# Altium footprint library CONN_HDR_MINI_ST_SMD.PcbLib: 102 footprints (part 5 of 7)
Each footprint in its own frame and in the unit in brackets; x right, y up, seen from the top. Pads: shape width x height; smd on the part's side, far side on the other; paste and mask are expansions set on the pad; w line width, h text height; cw(c..) or ccw(c..) is an arc to the next point about the centre after c.
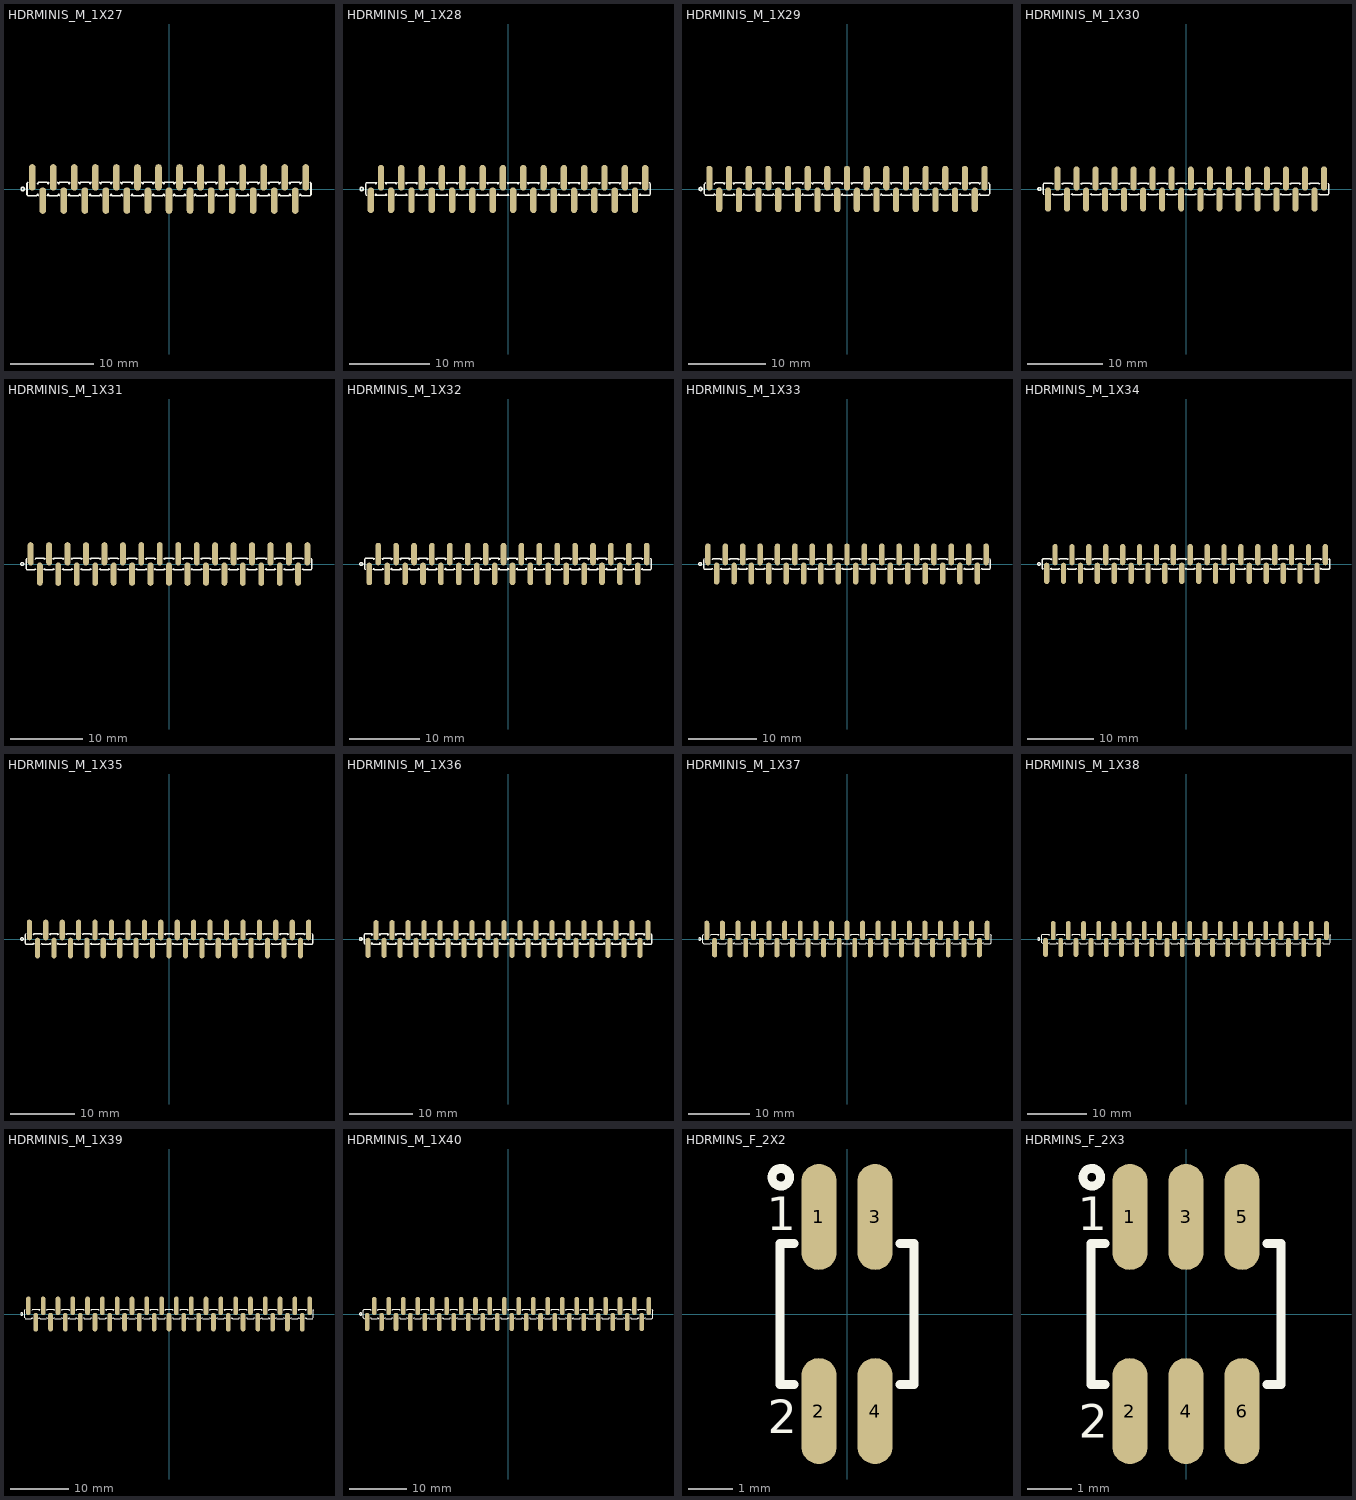
[diagram p4: the footprints below, top view; thin cyan lines are the x and y axes]

## HDRMINIS_M_1X27 [mm] "mini header (50mil pitch)"
pads (27):
  oval 0.8x3.2 smd mask+0.1: 1(-16.51,1.4) 2(-15.24,-1.4) 3(-13.97,1.4) 4(-12.7,-1.4) 5(-11.43,1.4) 6(-10.16,-1.4) 7(-8.89,1.4) 8(-7.62,-1.4) 9(-6.35,1.4) 10(-5.08,-1.4) 11(-3.81,1.4) 12(-2.54,-1.4) 13(-1.27,1.4) 14(0,-1.4) 15(1.27,1.4) 16(2.54,-1.4) 17(3.81,1.4) 18(5.08,-1.4) 19(6.35,1.4) 20(7.62,-1.4) 21(8.89,1.4) 22(10.16,-1.4) 23(11.43,1.4) 24(12.7,-1.4) 25(13.97,1.4) 26(15.24,-1.4) 27(16.51,1.4)
Top Overlay:
  circle w0.2: c-17.653,0 r0.2
  lines w0.2: -17.046,0.8 -17.145,0.635 -17.145,-0.635 -17.046,-0.8 -15.974,-0.8 -15.875,-0.635 -15.776,-0.8 ; -15.875,0.635 -15.776,0.8 -14.704,0.8 -14.605,0.635 -14.506,0.8 ; -14.704,-0.8 -14.605,-0.635 -14.506,-0.8 -13.434,-0.8 -13.335,-0.635 -13.236,-0.8 ; -13.434,0.8 -13.335,0.635 -13.236,0.8 -12.164,0.8 -12.065,0.635 -11.966,0.8 ; -12.164,-0.8 -12.065,-0.635 -11.966,-0.8 -10.894,-0.8 -10.795,-0.635 -10.696,-0.8 ; -10.894,0.8 -10.795,0.635 -10.696,0.8 -9.624,0.8 -9.525,0.635 -9.426,0.8 ; -9.624,-0.8 -9.525,-0.635 -9.426,-0.8 -8.354,-0.8 -8.255,-0.635 -8.156,-0.8 ; -8.354,0.8 -8.255,0.635 -8.156,0.8 -7.084,0.8 -6.985,0.635 -6.886,0.8 ; -7.084,-0.8 -6.985,-0.635 -6.886,-0.8 -5.814,-0.8 -5.715,-0.635 -5.616,-0.8 ; -5.814,0.8 -5.715,0.635 -5.616,0.8 -4.544,0.8 -4.445,0.635 -4.346,0.8 ; -4.544,-0.8 -4.445,-0.635 -4.346,-0.8 -3.274,-0.8 -3.175,-0.635 -3.076,-0.8 ; -3.274,0.8 -3.175,0.635 -3.076,0.8 -2.004,0.8 -1.905,0.635 -1.806,0.8 ; -2.004,-0.8 -1.905,-0.635 -1.806,-0.8 -0.734,-0.8 -0.635,-0.635 -0.536,-0.8 ; -0.734,0.8 -0.635,0.635 -0.536,0.8 0.536,0.8 0.635,0.635 0.734,0.8 ; 0.536,-0.8 0.635,-0.635 0.734,-0.8 1.806,-0.8 1.905,-0.635 2.004,-0.8 ; 1.806,0.8 1.905,0.635 2.004,0.8 3.076,0.8 3.175,0.635 3.274,0.8 ; 3.076,-0.8 3.175,-0.635 3.274,-0.8 4.346,-0.8 4.445,-0.635 4.544,-0.8 ; 4.346,0.8 4.445,0.635 4.544,0.8 5.616,0.8 5.715,0.635 5.814,0.8 ; 5.616,-0.8 5.715,-0.635 5.814,-0.8 6.886,-0.8 6.985,-0.635 7.084,-0.8 ; 6.886,0.8 6.985,0.635 7.084,0.8 8.156,0.8 8.255,0.635 8.354,0.8 ; 8.156,-0.8 8.255,-0.635 8.354,-0.8 9.426,-0.8 9.525,-0.635 9.624,-0.8 ; 9.426,0.8 9.525,0.635 9.624,0.8 10.696,0.8 10.795,0.635 10.894,0.8 ; 10.696,-0.8 10.795,-0.635 10.894,-0.8 11.966,-0.8 12.065,-0.635 12.164,-0.8 ; 11.966,0.8 12.065,0.635 12.164,0.8 13.236,0.8 13.335,0.635 13.434,0.8 ; 13.236,-0.8 13.335,-0.635 13.434,-0.8 14.506,-0.8 14.605,-0.635 14.704,-0.8 ; 14.506,0.8 14.605,0.635 14.704,0.8 15.776,0.8 15.875,0.635 15.974,0.8 ; 15.776,-0.8 15.875,-0.635 15.974,-0.8 17.046,-0.8 17.145,-0.635 17.145,0.635 17.046,0.8
3D body "BD021-02A-A1-0350-0200-0550-LB.stp": height 5.5, standoff 0, extent 14.605,-2.75 17.145,2.75
3D body "BD021-02A-A1-0350-0200-0550-LB.stp": height 5.5, standoff 0, extent 12.065,-2.75 14.605,2.75
3D body "BD021-02A-A1-0350-0200-0550-LB.stp": height 5.5, standoff 0, extent 9.525,-2.75 12.065,2.75
3D body "BD021-02A-A1-0350-0200-0550-LB.stp": height 5.5, standoff 0, extent 6.985,-2.75 9.525,2.75
3D body "BD021-02A-A1-0350-0200-0550-LB.stp": height 5.5, standoff 0, extent 4.445,-2.75 6.985,2.75
3D body "BD021-02A-A1-0350-0200-0550-LB.stp": height 5.5, standoff 0, extent 1.905,-2.75 4.445,2.75
3D body "BD021-02A-A1-0350-0200-0550-LB.stp": height 5.5, standoff 0, extent -0.635,-2.75 1.905,2.75
3D body "BD021-02A-A1-0350-0200-0550-LB.stp": height 5.5, standoff 0, extent -3.175,-2.75 -0.635,2.75
3D body "BD021-02A-A1-0350-0200-0550-LB.stp": height 5.5, standoff 0, extent -5.715,-2.75 -3.175,2.75
3D body "BD021-02A-A1-0350-0200-0550-LB.stp": height 5.5, standoff 0, extent -8.255,-2.75 -5.715,2.75
3D body "BD021-02A-A1-0350-0200-0550-LB.stp": height 5.5, standoff 0, extent -10.795,-2.75 -8.255,2.75
3D body "BD021-02A-A1-0350-0200-0550-LB.stp": height 5.5, standoff 0, extent -13.335,-2.75 -10.795,2.75
3D body "BD021-03A-A1-0350-0200-0550-LB.stp": height 5.5, standoff 0, extent -17.15,-2.75 -13.34,2.75

## HDRMINIS_M_1X28 [mm] "mini header (50mil pitch)"
pads (28):
  oval 0.8x3.2 smd mask+0.1: 1(-17.145,-1.4) 2(-15.875,1.4) 3(-14.605,-1.4) 4(-13.335,1.4) 5(-12.065,-1.4) 6(-10.795,1.4) 7(-9.525,-1.4) 8(-8.255,1.4) 9(-6.985,-1.4) 10(-5.715,1.4) 11(-4.445,-1.4) 12(-3.175,1.4) 13(-1.905,-1.4) 14(-0.635,1.4) 15(0.635,-1.4) 16(1.905,1.4) 17(3.175,-1.4) 18(4.445,1.4) 19(5.715,-1.4) 20(6.985,1.4) 21(8.255,-1.4) 22(9.525,1.4) 23(10.795,-1.4) 24(12.065,1.4) 25(13.335,-1.4) 26(14.605,1.4) 27(15.875,-1.4) 28(17.145,1.4)
Top Overlay:
  circle w0.2: c-18.288,0 r0.2
  lines w0.2: -17.681,-0.8 -17.78,-0.635 -17.78,0.635 -17.681,0.8 -16.609,0.8 -16.51,0.635 -16.411,0.8 ; -16.609,-0.8 -16.51,-0.635 -16.411,-0.8 -15.339,-0.8 -15.24,-0.635 -15.141,-0.8 ; -15.339,0.8 -15.24,0.635 -15.141,0.8 -14.069,0.8 -13.97,0.635 -13.871,0.8 ; -14.069,-0.8 -13.97,-0.635 -13.871,-0.8 -12.799,-0.8 -12.7,-0.635 -12.601,-0.8 ; -12.799,0.8 -12.7,0.635 -12.601,0.8 -11.529,0.8 -11.43,0.635 -11.331,0.8 ; -11.529,-0.8 -11.43,-0.635 -11.331,-0.8 -10.259,-0.8 -10.16,-0.635 -10.061,-0.8 ; -10.259,0.8 -10.16,0.635 -10.061,0.8 -8.989,0.8 -8.89,0.635 -8.791,0.8 ; -8.989,-0.8 -8.89,-0.635 -8.791,-0.8 -7.719,-0.8 -7.62,-0.635 -7.521,-0.8 ; -7.719,0.8 -7.62,0.635 -7.521,0.8 -6.449,0.8 -6.35,0.635 -6.251,0.8 ; -6.449,-0.8 -6.35,-0.635 -6.251,-0.8 -5.179,-0.8 -5.08,-0.635 -4.981,-0.8 ; -5.179,0.8 -5.08,0.635 -4.981,0.8 -3.909,0.8 -3.81,0.635 -3.711,0.8 ; -3.909,-0.8 -3.81,-0.635 -3.711,-0.8 -2.639,-0.8 -2.54,-0.635 -2.441,-0.8 ; -2.639,0.8 -2.54,0.635 -2.441,0.8 -1.369,0.8 -1.27,0.635 -1.171,0.8 ; -1.369,-0.8 -1.27,-0.635 -1.171,-0.8 -0.099,-0.8 0,-0.635 0.099,-0.8 ; -0.099,0.8 0,0.635 0.099,0.8 1.171,0.8 1.27,0.635 1.369,0.8 ; 1.171,-0.8 1.27,-0.635 1.369,-0.8 2.441,-0.8 2.54,-0.635 2.639,-0.8 ; 2.441,0.8 2.54,0.635 2.639,0.8 3.711,0.8 3.81,0.635 3.909,0.8 ; 3.711,-0.8 3.81,-0.635 3.909,-0.8 4.981,-0.8 5.08,-0.635 5.179,-0.8 ; 4.981,0.8 5.08,0.635 5.179,0.8 6.251,0.8 6.35,0.635 6.449,0.8 ; 6.251,-0.8 6.35,-0.635 6.449,-0.8 7.521,-0.8 7.62,-0.635 7.719,-0.8 ; 7.521,0.8 7.62,0.635 7.719,0.8 8.791,0.8 8.89,0.635 8.989,0.8 ; 8.791,-0.8 8.89,-0.635 8.989,-0.8 10.061,-0.8 10.16,-0.635 10.259,-0.8 ; 10.061,0.8 10.16,0.635 10.259,0.8 11.331,0.8 11.43,0.635 11.529,0.8 ; 11.331,-0.8 11.43,-0.635 11.529,-0.8 12.601,-0.8 12.7,-0.635 12.799,-0.8 ; 12.601,0.8 12.7,0.635 12.799,0.8 13.871,0.8 13.97,0.635 14.069,0.8 ; 13.871,-0.8 13.97,-0.635 14.069,-0.8 15.141,-0.8 15.24,-0.635 15.339,-0.8 ; 15.141,0.8 15.24,0.635 15.339,0.8 16.411,0.8 16.51,0.635 16.609,0.8 ; 16.411,-0.8 16.51,-0.635 16.609,-0.8 17.681,-0.8 17.78,-0.635 17.78,0.635 17.681,0.8
3D body "BD021-02A-A1-0350-0200-0550-LB.stp": height 5.5, standoff 0, extent -17.78,-2.75 -15.24,2.75
3D body "BD021-02A-A1-0350-0200-0550-LB.stp": height 5.5, standoff 0, extent -15.24,-2.75 -12.7,2.75
3D body "BD021-02A-A1-0350-0200-0550-LB.stp": height 5.5, standoff 0, extent -12.7,-2.75 -10.16,2.75
3D body "BD021-02A-A1-0350-0200-0550-LB.stp": height 5.5, standoff 0, extent -10.16,-2.75 -7.62,2.75
3D body "BD021-02A-A1-0350-0200-0550-LB.stp": height 5.5, standoff 0, extent -7.62,-2.75 -5.08,2.75
3D body "BD021-02A-A1-0350-0200-0550-LB.stp": height 5.5, standoff 0, extent -5.08,-2.75 -2.54,2.75
3D body "BD021-02A-A1-0350-0200-0550-LB.stp": height 5.5, standoff 0, extent -2.54,-2.75 0,2.75
3D body "BD021-02A-A1-0350-0200-0550-LB.stp": height 5.5, standoff 0, extent 0,-2.75 2.54,2.75
3D body "BD021-02A-A1-0350-0200-0550-LB.stp": height 5.5, standoff 0, extent 2.54,-2.75 5.08,2.75
3D body "BD021-02A-A1-0350-0200-0550-LB.stp": height 5.5, standoff 0, extent 5.08,-2.75 7.62,2.75
3D body "BD021-02A-A1-0350-0200-0550-LB.stp": height 5.5, standoff 0, extent 7.62,-2.75 10.16,2.75
3D body "BD021-02A-A1-0350-0200-0550-LB.stp": height 5.5, standoff 0, extent 10.16,-2.75 12.7,2.75
3D body "BD021-02A-A1-0350-0200-0550-LB.stp": height 5.5, standoff 0, extent 12.7,-2.75 15.24,2.75
3D body "BD021-02A-A1-0350-0200-0550-LB.stp": height 5.5, standoff 0, extent 15.24,-2.75 17.78,2.75

## HDRMINIS_M_1X29 [mm] "mini header (50mil pitch)"
pads (29):
  oval 0.8x3.2 smd mask+0.1: 1(-17.78,1.4) 2(-16.51,-1.4) 3(-15.24,1.4) 4(-13.97,-1.4) 5(-12.7,1.4) 6(-11.43,-1.4) 7(-10.16,1.4) 8(-8.89,-1.4) 9(-7.62,1.4) 10(-6.35,-1.4) 11(-5.08,1.4) 12(-3.81,-1.4) 13(-2.54,1.4) 14(-1.27,-1.4) 15(0,1.4) 16(1.27,-1.4) 17(2.54,1.4) 18(3.81,-1.4) 19(5.08,1.4) 20(6.35,-1.4) 21(7.62,1.4) 22(8.89,-1.4) 23(10.16,1.4) 24(11.43,-1.4) 25(12.7,1.4) 26(13.97,-1.4) 27(15.24,1.4) 28(16.51,-1.4) 29(17.78,1.4)
Top Overlay:
  circle w0.2: c-18.923,0 r0.2
  lines w0.2: -18.316,0.8 -18.415,0.635 -18.415,-0.635 -18.316,-0.8 -17.244,-0.8 -17.145,-0.635 -17.046,-0.8 ; -17.145,0.635 -17.046,0.8 -15.974,0.8 -15.875,0.635 -15.776,0.8 ; -15.974,-0.8 -15.875,-0.635 -15.776,-0.8 -14.704,-0.8 -14.605,-0.635 -14.506,-0.8 ; -14.704,0.8 -14.605,0.635 -14.506,0.8 -13.434,0.8 -13.335,0.635 -13.236,0.8 ; -13.434,-0.8 -13.335,-0.635 -13.236,-0.8 -12.164,-0.8 -12.065,-0.635 -11.966,-0.8 ; -12.164,0.8 -12.065,0.635 -11.966,0.8 -10.894,0.8 -10.795,0.635 -10.696,0.8 ; -10.894,-0.8 -10.795,-0.635 -10.696,-0.8 -9.624,-0.8 -9.525,-0.635 -9.426,-0.8 ; -9.624,0.8 -9.525,0.635 -9.426,0.8 -8.354,0.8 -8.255,0.635 -8.156,0.8 ; -8.354,-0.8 -8.255,-0.635 -8.156,-0.8 -7.084,-0.8 -6.985,-0.635 -6.886,-0.8 ; -7.084,0.8 -6.985,0.635 -6.886,0.8 -5.814,0.8 -5.715,0.635 -5.616,0.8 ; -5.814,-0.8 -5.715,-0.635 -5.616,-0.8 -4.544,-0.8 -4.445,-0.635 -4.346,-0.8 ; -4.544,0.8 -4.445,0.635 -4.346,0.8 -3.274,0.8 -3.175,0.635 -3.076,0.8 ; -3.274,-0.8 -3.175,-0.635 -3.076,-0.8 -2.004,-0.8 -1.905,-0.635 -1.806,-0.8 ; -2.004,0.8 -1.905,0.635 -1.806,0.8 -0.734,0.8 -0.635,0.635 -0.536,0.8 ; -0.734,-0.8 -0.635,-0.635 -0.536,-0.8 0.536,-0.8 0.635,-0.635 0.734,-0.8 ; 0.536,0.8 0.635,0.635 0.734,0.8 1.806,0.8 1.905,0.635 2.004,0.8 ; 1.806,-0.8 1.905,-0.635 2.004,-0.8 3.076,-0.8 3.175,-0.635 3.274,-0.8 ; 3.076,0.8 3.175,0.635 3.274,0.8 4.346,0.8 4.445,0.635 4.544,0.8 ; 4.346,-0.8 4.445,-0.635 4.544,-0.8 5.616,-0.8 5.715,-0.635 5.814,-0.8 ; 5.616,0.8 5.715,0.635 5.814,0.8 6.886,0.8 6.985,0.635 7.084,0.8 ; 6.886,-0.8 6.985,-0.635 7.084,-0.8 8.156,-0.8 8.255,-0.635 8.354,-0.8 ; 8.156,0.8 8.255,0.635 8.354,0.8 9.426,0.8 9.525,0.635 9.624,0.8 ; 9.426,-0.8 9.525,-0.635 9.624,-0.8 10.696,-0.8 10.795,-0.635 10.894,-0.8 ; 10.696,0.8 10.795,0.635 10.894,0.8 11.966,0.8 12.065,0.635 12.164,0.8 ; 11.966,-0.8 12.065,-0.635 12.164,-0.8 13.236,-0.8 13.335,-0.635 13.434,-0.8 ; 13.236,0.8 13.335,0.635 13.434,0.8 14.506,0.8 14.605,0.635 14.704,0.8 ; 14.506,-0.8 14.605,-0.635 14.704,-0.8 15.776,-0.8 15.875,-0.635 15.974,-0.8 ; 15.776,0.8 15.875,0.635 15.974,0.8 17.046,0.8 17.145,0.635 17.244,0.8 ; 17.046,-0.8 17.145,-0.635 17.244,-0.8 18.316,-0.8 18.415,-0.635 18.415,0.635 18.316,0.8
3D body "BD021-02A-A1-0350-0200-0550-LB.stp": height 5.5, standoff 0, extent 15.875,-2.75 18.415,2.75
3D body "BD021-02A-A1-0350-0200-0550-LB.stp": height 5.5, standoff 0, extent 13.335,-2.75 15.875,2.75
3D body "BD021-02A-A1-0350-0200-0550-LB.stp": height 5.5, standoff 0, extent 10.795,-2.75 13.335,2.75
3D body "BD021-02A-A1-0350-0200-0550-LB.stp": height 5.5, standoff 0, extent 8.255,-2.75 10.795,2.75
3D body "BD021-02A-A1-0350-0200-0550-LB.stp": height 5.5, standoff 0, extent 5.715,-2.75 8.255,2.75
3D body "BD021-02A-A1-0350-0200-0550-LB.stp": height 5.5, standoff 0, extent 3.175,-2.75 5.715,2.75
3D body "BD021-02A-A1-0350-0200-0550-LB.stp": height 5.5, standoff 0, extent 0.635,-2.75 3.175,2.75
3D body "BD021-02A-A1-0350-0200-0550-LB.stp": height 5.5, standoff 0, extent -1.905,-2.75 0.635,2.75
3D body "BD021-02A-A1-0350-0200-0550-LB.stp": height 5.5, standoff 0, extent -4.445,-2.75 -1.905,2.75
3D body "BD021-02A-A1-0350-0200-0550-LB.stp": height 5.5, standoff 0, extent -6.985,-2.75 -4.445,2.75
3D body "BD021-02A-A1-0350-0200-0550-LB.stp": height 5.5, standoff 0, extent -9.525,-2.75 -6.985,2.75
3D body "BD021-02A-A1-0350-0200-0550-LB.stp": height 5.5, standoff 0, extent -12.065,-2.75 -9.525,2.75
3D body "BD021-02A-A1-0350-0200-0550-LB.stp": height 5.5, standoff 0, extent -14.605,-2.75 -12.065,2.75
3D body "BD021-03A-A1-0350-0200-0550-LB.stp": height 5.5, standoff 0, extent -18.42,-2.75 -14.61,2.75

## HDRMINIS_M_1X30 [mm] "mini header (50mil pitch)"
pads (30):
  oval 0.8x3.2 smd mask+0.1: 1(-18.415,-1.4) 2(-17.145,1.4) 3(-15.875,-1.4) 4(-14.605,1.4) 5(-13.335,-1.4) 6(-12.065,1.4) 7(-10.795,-1.4) 8(-9.525,1.4) 9(-8.255,-1.4) 10(-6.985,1.4) 11(-5.715,-1.4) 12(-4.445,1.4) 13(-3.175,-1.4) 14(-1.905,1.4) 15(-0.635,-1.4) 16(0.635,1.4) 17(1.905,-1.4) 18(3.175,1.4) 19(4.445,-1.4) 20(5.715,1.4) 21(6.985,-1.4) 22(8.255,1.4) 23(9.525,-1.4) 24(10.795,1.4) 25(12.065,-1.4) 26(13.335,1.4) 27(14.605,-1.4) 28(15.875,1.4) 29(17.145,-1.4) 30(18.415,1.4)
Top Overlay:
  drawing of 153 lines, arcs and shapes, not listed
3D body "BD021-02A-A1-0350-0200-0550-LB.stp": height 5.5, standoff 0, extent -19.05,-2.75 -16.51,2.75
3D body "BD021-02A-A1-0350-0200-0550-LB.stp": height 5.5, standoff 0, extent -16.51,-2.75 -13.97,2.75
3D body "BD021-02A-A1-0350-0200-0550-LB.stp": height 5.5, standoff 0, extent -13.97,-2.75 -11.43,2.75
3D body "BD021-02A-A1-0350-0200-0550-LB.stp": height 5.5, standoff 0, extent -11.43,-2.75 -8.89,2.75
3D body "BD021-02A-A1-0350-0200-0550-LB.stp": height 5.5, standoff 0, extent -8.89,-2.75 -6.35,2.75
3D body "BD021-02A-A1-0350-0200-0550-LB.stp": height 5.5, standoff 0, extent -6.35,-2.75 -3.81,2.75
3D body "BD021-02A-A1-0350-0200-0550-LB.stp": height 5.5, standoff 0, extent -3.81,-2.75 -1.27,2.75
3D body "BD021-02A-A1-0350-0200-0550-LB.stp": height 5.5, standoff 0, extent -1.27,-2.75 1.27,2.75
3D body "BD021-02A-A1-0350-0200-0550-LB.stp": height 5.5, standoff 0, extent 1.27,-2.75 3.81,2.75
3D body "BD021-02A-A1-0350-0200-0550-LB.stp": height 5.5, standoff 0, extent 3.81,-2.75 6.35,2.75
3D body "BD021-02A-A1-0350-0200-0550-LB.stp": height 5.5, standoff 0, extent 6.35,-2.75 8.89,2.75
3D body "BD021-02A-A1-0350-0200-0550-LB.stp": height 5.5, standoff 0, extent 8.89,-2.75 11.43,2.75
3D body "BD021-02A-A1-0350-0200-0550-LB.stp": height 5.5, standoff 0, extent 11.43,-2.75 13.97,2.75
3D body "BD021-02A-A1-0350-0200-0550-LB.stp": height 5.5, standoff 0, extent 13.97,-2.75 16.51,2.75
3D body "BD021-02A-A1-0350-0200-0550-LB.stp": height 5.5, standoff 0, extent 16.51,-2.75 19.05,2.75

## HDRMINIS_M_1X31 [mm] "mini header (50mil pitch)"
pads (31):
  oval 0.8x3.2 smd mask+0.1: 1(-19.05,1.4) 2(-17.78,-1.4) 3(-16.51,1.4) 4(-15.24,-1.4) 5(-13.97,1.4) 6(-12.7,-1.4) 7(-11.43,1.4) 8(-10.16,-1.4) 9(-8.89,1.4) 10(-7.62,-1.4) 11(-6.35,1.4) 12(-5.08,-1.4) 13(-3.81,1.4) 14(-2.54,-1.4) 15(-1.27,1.4) 16(0,-1.4) 17(1.27,1.4) 18(2.54,-1.4) 19(3.81,1.4) 20(5.08,-1.4) 21(6.35,1.4) 22(7.62,-1.4) 23(8.89,1.4) 24(10.16,-1.4) 25(11.43,1.4) 26(12.7,-1.4) 27(13.97,1.4) 28(15.24,-1.4) 29(16.51,1.4) 30(17.78,-1.4) 31(19.05,1.4)
Top Overlay:
  drawing of 157 lines, arcs and shapes, not listed
3D body "BD021-03A-A1-0350-0200-0550-LB.stp": height 5.5, standoff 0, extent -19.69,-2.75 -15.88,2.75
3D body "BD021-02A-A1-0350-0200-0550-LB.stp": height 5.5, standoff 0, extent -15.875,-2.75 -13.335,2.75
3D body "BD021-02A-A1-0350-0200-0550-LB.stp": height 5.5, standoff 0, extent -13.335,-2.75 -10.795,2.75
3D body "BD021-02A-A1-0350-0200-0550-LB.stp": height 5.5, standoff 0, extent -10.795,-2.75 -8.255,2.75
3D body "BD021-02A-A1-0350-0200-0550-LB.stp": height 5.5, standoff 0, extent -8.255,-2.75 -5.715,2.75
3D body "BD021-02A-A1-0350-0200-0550-LB.stp": height 5.5, standoff 0, extent -5.715,-2.75 -3.175,2.75
3D body "BD021-02A-A1-0350-0200-0550-LB.stp": height 5.5, standoff 0, extent -3.175,-2.75 -0.635,2.75
3D body "BD021-02A-A1-0350-0200-0550-LB.stp": height 5.5, standoff 0, extent -0.635,-2.75 1.905,2.75
3D body "BD021-02A-A1-0350-0200-0550-LB.stp": height 5.5, standoff 0, extent 1.905,-2.75 4.445,2.75
3D body "BD021-02A-A1-0350-0200-0550-LB.stp": height 5.5, standoff 0, extent 4.445,-2.75 6.985,2.75
3D body "BD021-02A-A1-0350-0200-0550-LB.stp": height 5.5, standoff 0, extent 6.985,-2.75 9.525,2.75
3D body "BD021-02A-A1-0350-0200-0550-LB.stp": height 5.5, standoff 0, extent 9.525,-2.75 12.065,2.75
3D body "BD021-02A-A1-0350-0200-0550-LB.stp": height 5.5, standoff 0, extent 12.065,-2.75 14.605,2.75
3D body "BD021-02A-A1-0350-0200-0550-LB.stp": height 5.5, standoff 0, extent 14.605,-2.75 17.145,2.75
3D body "BD021-02A-A1-0350-0200-0550-LB.stp": height 5.5, standoff 0, extent 17.145,-2.75 19.685,2.75

## HDRMINIS_M_1X32 [mm] "mini header (50mil pitch)"
pads (32):
  oval 0.8x3.2 smd mask+0.1: 1(-19.685,-1.4) 2(-18.415,1.4) 3(-17.145,-1.4) 4(-15.875,1.4) 5(-14.605,-1.4) 6(-13.335,1.4) 7(-12.065,-1.4) 8(-10.795,1.4) 9(-9.525,-1.4) 10(-8.255,1.4) 11(-6.985,-1.4) 12(-5.715,1.4) 13(-4.445,-1.4) 14(-3.175,1.4) 15(-1.905,-1.4) 16(-0.635,1.4) 17(0.635,-1.4) 18(1.905,1.4) 19(3.175,-1.4) 20(4.445,1.4) 21(5.715,-1.4) 22(6.985,1.4) 23(8.255,-1.4) 24(9.525,1.4) 25(10.795,-1.4) 26(12.065,1.4) 27(13.335,-1.4) 28(14.605,1.4) 29(15.875,-1.4) 30(17.145,1.4) 31(18.415,-1.4) 32(19.685,1.4)
Top Overlay:
  drawing of 163 lines, arcs and shapes, not listed
3D body "BD021-02A-A1-0350-0200-0550-LB.stp": height 5.5, standoff 0, extent -20.32,-2.75 -17.78,2.75
3D body "BD021-02A-A1-0350-0200-0550-LB.stp": height 5.5, standoff 0, extent -17.78,-2.75 -15.24,2.75
3D body "BD021-02A-A1-0350-0200-0550-LB.stp": height 5.5, standoff 0, extent -15.24,-2.75 -12.7,2.75
3D body "BD021-02A-A1-0350-0200-0550-LB.stp": height 5.5, standoff 0, extent -12.7,-2.75 -10.16,2.75
3D body "BD021-02A-A1-0350-0200-0550-LB.stp": height 5.5, standoff 0, extent -10.16,-2.75 -7.62,2.75
3D body "BD021-02A-A1-0350-0200-0550-LB.stp": height 5.5, standoff 0, extent -7.62,-2.75 -5.08,2.75
3D body "BD021-02A-A1-0350-0200-0550-LB.stp": height 5.5, standoff 0, extent -5.08,-2.75 -2.54,2.75
3D body "BD021-02A-A1-0350-0200-0550-LB.stp": height 5.5, standoff 0, extent -2.54,-2.75 0,2.75
3D body "BD021-02A-A1-0350-0200-0550-LB.stp": height 5.5, standoff 0, extent 0,-2.75 2.54,2.75
3D body "BD021-02A-A1-0350-0200-0550-LB.stp": height 5.5, standoff 0, extent 2.54,-2.75 5.08,2.75
3D body "BD021-02A-A1-0350-0200-0550-LB.stp": height 5.5, standoff 0, extent 5.08,-2.75 7.62,2.75
3D body "BD021-02A-A1-0350-0200-0550-LB.stp": height 5.5, standoff 0, extent 7.62,-2.75 10.16,2.75
3D body "BD021-02A-A1-0350-0200-0550-LB.stp": height 5.5, standoff 0, extent 10.16,-2.75 12.7,2.75
3D body "BD021-02A-A1-0350-0200-0550-LB.stp": height 5.5, standoff 0, extent 12.7,-2.75 15.24,2.75
3D body "BD021-02A-A1-0350-0200-0550-LB.stp": height 5.5, standoff 0, extent 15.24,-2.75 17.78,2.75
3D body "BD021-02A-A1-0350-0200-0550-LB.stp": height 5.5, standoff 0, extent 17.78,-2.75 20.32,2.75

## HDRMINIS_M_1X33 [mm] "mini header (50mil pitch)"
pads (33):
  oval 0.8x3.2 smd mask+0.1: 1(-20.32,1.4) 2(-19.05,-1.4) 3(-17.78,1.4) 4(-16.51,-1.4) 5(-15.24,1.4) 6(-13.97,-1.4) 7(-12.7,1.4) 8(-11.43,-1.4) 9(-10.16,1.4) 10(-8.89,-1.4) 11(-7.62,1.4) 12(-6.35,-1.4) 13(-5.08,1.4) 14(-3.81,-1.4) 15(-2.54,1.4) 16(-1.27,-1.4) 17(0,1.4) 18(1.27,-1.4) 19(2.54,1.4) 20(3.81,-1.4) 21(5.08,1.4) 22(6.35,-1.4) 23(7.62,1.4) 24(8.89,-1.4) 25(10.16,1.4) 26(11.43,-1.4) 27(12.7,1.4) 28(13.97,-1.4) 29(15.24,1.4) 30(16.51,-1.4) 31(17.78,1.4) 32(19.05,-1.4) 33(20.32,1.4)
Top Overlay:
  drawing of 167 lines, arcs and shapes, not listed
3D body "BD021-03A-A1-0350-0200-0550-LB.stp": height 5.5, standoff 0, extent -20.96,-2.75 -17.15,2.75
3D body "BD021-02A-A1-0350-0200-0550-LB.stp": height 5.5, standoff 0, extent -17.145,-2.75 -14.605,2.75
3D body "BD021-02A-A1-0350-0200-0550-LB.stp": height 5.5, standoff 0, extent -14.605,-2.75 -12.065,2.75
3D body "BD021-02A-A1-0350-0200-0550-LB.stp": height 5.5, standoff 0, extent -12.065,-2.75 -9.525,2.75
3D body "BD021-02A-A1-0350-0200-0550-LB.stp": height 5.5, standoff 0, extent -9.525,-2.75 -6.985,2.75
3D body "BD021-02A-A1-0350-0200-0550-LB.stp": height 5.5, standoff 0, extent -6.985,-2.75 -4.445,2.75
3D body "BD021-02A-A1-0350-0200-0550-LB.stp": height 5.5, standoff 0, extent -4.445,-2.75 -1.905,2.75
3D body "BD021-02A-A1-0350-0200-0550-LB.stp": height 5.5, standoff 0, extent -1.905,-2.75 0.635,2.75
3D body "BD021-02A-A1-0350-0200-0550-LB.stp": height 5.5, standoff 0, extent 0.635,-2.75 3.175,2.75
3D body "BD021-02A-A1-0350-0200-0550-LB.stp": height 5.5, standoff 0, extent 3.175,-2.75 5.715,2.75
3D body "BD021-02A-A1-0350-0200-0550-LB.stp": height 5.5, standoff 0, extent 5.715,-2.75 8.255,2.75
3D body "BD021-02A-A1-0350-0200-0550-LB.stp": height 5.5, standoff 0, extent 8.255,-2.75 10.795,2.75
3D body "BD021-02A-A1-0350-0200-0550-LB.stp": height 5.5, standoff 0, extent 10.795,-2.75 13.335,2.75
3D body "BD021-02A-A1-0350-0200-0550-LB.stp": height 5.5, standoff 0, extent 13.335,-2.75 15.875,2.75
3D body "BD021-02A-A1-0350-0200-0550-LB.stp": height 5.5, standoff 0, extent 15.875,-2.75 18.415,2.75
3D body "BD021-02A-A1-0350-0200-0550-LB.stp": height 5.5, standoff 0, extent 18.415,-2.75 20.955,2.75

## HDRMINIS_M_1X34 [mm] "mini header (50mil pitch)"
pads (34):
  oval 0.8x3.2 smd mask+0.1: 1(-20.955,-1.4) 2(-19.685,1.4) 3(-18.415,-1.4) 4(-17.145,1.4) 5(-15.875,-1.4) 6(-14.605,1.4) 7(-13.335,-1.4) 8(-12.065,1.4) 9(-10.795,-1.4) 10(-9.525,1.4) 11(-8.255,-1.4) 12(-6.985,1.4) 13(-5.715,-1.4) 14(-4.445,1.4) 15(-3.175,-1.4) 16(-1.905,1.4) 17(-0.635,-1.4) 18(0.635,1.4) 19(1.905,-1.4) 20(3.175,1.4) 21(4.445,-1.4) 22(5.715,1.4) 23(6.985,-1.4) 24(8.255,1.4) 25(9.525,-1.4) 26(10.795,1.4) 27(12.065,-1.4) 28(13.335,1.4) 29(14.605,-1.4) 30(15.875,1.4) 31(17.145,-1.4) 32(18.415,1.4) 33(19.685,-1.4) 34(20.955,1.4)
Top Overlay:
  drawing of 173 lines, arcs and shapes, not listed
3D body "BD021-02A-A1-0350-0200-0550-LB.stp": height 5.5, standoff 0, extent 19.05,-2.75 21.59,2.75
3D body "BD021-02A-A1-0350-0200-0550-LB.stp": height 5.5, standoff 0, extent 16.51,-2.75 19.05,2.75
3D body "BD021-02A-A1-0350-0200-0550-LB.stp": height 5.5, standoff 0, extent 13.97,-2.75 16.51,2.75
3D body "BD021-02A-A1-0350-0200-0550-LB.stp": height 5.5, standoff 0, extent 11.43,-2.75 13.97,2.75
3D body "BD021-02A-A1-0350-0200-0550-LB.stp": height 5.5, standoff 0, extent 8.89,-2.75 11.43,2.75
3D body "BD021-02A-A1-0350-0200-0550-LB.stp": height 5.5, standoff 0, extent 6.35,-2.75 8.89,2.75
3D body "BD021-02A-A1-0350-0200-0550-LB.stp": height 5.5, standoff 0, extent 3.81,-2.75 6.35,2.75
3D body "BD021-02A-A1-0350-0200-0550-LB.stp": height 5.5, standoff 0, extent 1.27,-2.75 3.81,2.75
3D body "BD021-02A-A1-0350-0200-0550-LB.stp": height 5.5, standoff 0, extent -1.27,-2.75 1.27,2.75
3D body "BD021-02A-A1-0350-0200-0550-LB.stp": height 5.5, standoff 0, extent -3.81,-2.75 -1.27,2.75
3D body "BD021-02A-A1-0350-0200-0550-LB.stp": height 5.5, standoff 0, extent -6.35,-2.75 -3.81,2.75
3D body "BD021-02A-A1-0350-0200-0550-LB.stp": height 5.5, standoff 0, extent -8.89,-2.75 -6.35,2.75
3D body "BD021-02A-A1-0350-0200-0550-LB.stp": height 5.5, standoff 0, extent -11.43,-2.75 -8.89,2.75
3D body "BD021-02A-A1-0350-0200-0550-LB.stp": height 5.5, standoff 0, extent -13.97,-2.75 -11.43,2.75
3D body "BD021-02A-A1-0350-0200-0550-LB.stp": height 5.5, standoff 0, extent -16.51,-2.75 -13.97,2.75
3D body "BD021-02A-A1-0350-0200-0550-LB.stp": height 5.5, standoff 0, extent -19.05,-2.75 -16.51,2.75
3D body "BD021-02A-A1-0350-0200-0550-LB.stp": height 5.5, standoff 0, extent -21.59,-2.75 -19.05,2.75

## HDRMINIS_M_1X35 [mm] "mini header (50mil pitch)"
pads (35):
  oval 0.8x3.2 smd mask+0.1: 1(-21.59,1.4) 2(-20.32,-1.4) 3(-19.05,1.4) 4(-17.78,-1.4) 5(-16.51,1.4) 6(-15.24,-1.4) 7(-13.97,1.4) 8(-12.7,-1.4) 9(-11.43,1.4) 10(-10.16,-1.4) 11(-8.89,1.4) 12(-7.62,-1.4) 13(-6.35,1.4) 14(-5.08,-1.4) 15(-3.81,1.4) 16(-2.54,-1.4) 17(-1.27,1.4) 18(0,-1.4) 19(1.27,1.4) 20(2.54,-1.4) 21(3.81,1.4) 22(5.08,-1.4) 23(6.35,1.4) 24(7.62,-1.4) 25(8.89,1.4) 26(10.16,-1.4) 27(11.43,1.4) 28(12.7,-1.4) 29(13.97,1.4) 30(15.24,-1.4) 31(16.51,1.4) 32(17.78,-1.4) 33(19.05,1.4) 34(20.32,-1.4) 35(21.59,1.4)
Top Overlay:
  drawing of 177 lines, arcs and shapes, not listed
3D body "BD021-02A-A1-0350-0200-0550-LB.stp": height 5.5, standoff 0, extent 19.685,-2.75 22.225,2.75
3D body "BD021-02A-A1-0350-0200-0550-LB.stp": height 5.5, standoff 0, extent 17.145,-2.75 19.685,2.75
3D body "BD021-02A-A1-0350-0200-0550-LB.stp": height 5.5, standoff 0, extent 14.605,-2.75 17.145,2.75
3D body "BD021-02A-A1-0350-0200-0550-LB.stp": height 5.5, standoff 0, extent 12.065,-2.75 14.605,2.75
3D body "BD021-02A-A1-0350-0200-0550-LB.stp": height 5.5, standoff 0, extent 9.525,-2.75 12.065,2.75
3D body "BD021-02A-A1-0350-0200-0550-LB.stp": height 5.5, standoff 0, extent 6.985,-2.75 9.525,2.75
3D body "BD021-02A-A1-0350-0200-0550-LB.stp": height 5.5, standoff 0, extent 4.445,-2.75 6.985,2.75
3D body "BD021-02A-A1-0350-0200-0550-LB.stp": height 5.5, standoff 0, extent 1.905,-2.75 4.445,2.75
3D body "BD021-02A-A1-0350-0200-0550-LB.stp": height 5.5, standoff 0, extent -0.635,-2.75 1.905,2.75
3D body "BD021-02A-A1-0350-0200-0550-LB.stp": height 5.5, standoff 0, extent -3.175,-2.75 -0.635,2.75
3D body "BD021-02A-A1-0350-0200-0550-LB.stp": height 5.5, standoff 0, extent -5.715,-2.75 -3.175,2.75
3D body "BD021-02A-A1-0350-0200-0550-LB.stp": height 5.5, standoff 0, extent -8.255,-2.75 -5.715,2.75
3D body "BD021-02A-A1-0350-0200-0550-LB.stp": height 5.5, standoff 0, extent -10.795,-2.75 -8.255,2.75
3D body "BD021-02A-A1-0350-0200-0550-LB.stp": height 5.5, standoff 0, extent -13.335,-2.75 -10.795,2.75
3D body "BD021-02A-A1-0350-0200-0550-LB.stp": height 5.5, standoff 0, extent -15.875,-2.75 -13.335,2.75
3D body "BD021-02A-A1-0350-0200-0550-LB.stp": height 5.5, standoff 0, extent -18.415,-2.75 -15.875,2.75
3D body "BD021-03A-A1-0350-0200-0550-LB.stp": height 5.5, standoff 0, extent -22.23,-2.75 -18.42,2.75

## HDRMINIS_M_1X36 [mm] "mini header (50mil pitch)"
pads (36):
  oval 0.8x3.2 smd mask+0.1: 1(-22.225,-1.4) 2(-20.955,1.4) 3(-19.685,-1.4) 4(-18.415,1.4) 5(-17.145,-1.4) 6(-15.875,1.4) 7(-14.605,-1.4) 8(-13.335,1.4) 9(-12.065,-1.4) 10(-10.795,1.4) 11(-9.525,-1.4) 12(-8.255,1.4) 13(-6.985,-1.4) 14(-5.715,1.4) 15(-4.445,-1.4) 16(-3.175,1.4) 17(-1.905,-1.4) 18(-0.635,1.4) 19(0.635,-1.4) 20(1.905,1.4) 21(3.175,-1.4) 22(4.445,1.4) 23(5.715,-1.4) 24(6.985,1.4) 25(8.255,-1.4) 26(9.525,1.4) 27(10.795,-1.4) 28(12.065,1.4) 29(13.335,-1.4) 30(14.605,1.4) 31(15.875,-1.4) 32(17.145,1.4) 33(18.415,-1.4) 34(19.685,1.4) 35(20.955,-1.4) 36(22.225,1.4)
Top Overlay:
  drawing of 183 lines, arcs and shapes, not listed
3D body "BD021-02A-A1-0350-0200-0550-LB.stp": height 5.5, standoff 0, extent -22.86,-2.75 -20.32,2.75
3D body "BD021-02A-A1-0350-0200-0550-LB.stp": height 5.5, standoff 0, extent -20.32,-2.75 -17.78,2.75
3D body "BD021-02A-A1-0350-0200-0550-LB.stp": height 5.5, standoff 0, extent -17.78,-2.75 -15.24,2.75
3D body "BD021-02A-A1-0350-0200-0550-LB.stp": height 5.5, standoff 0, extent -15.24,-2.75 -12.7,2.75
3D body "BD021-02A-A1-0350-0200-0550-LB.stp": height 5.5, standoff 0, extent -12.7,-2.75 -10.16,2.75
3D body "BD021-02A-A1-0350-0200-0550-LB.stp": height 5.5, standoff 0, extent -10.16,-2.75 -7.62,2.75
3D body "BD021-02A-A1-0350-0200-0550-LB.stp": height 5.5, standoff 0, extent -7.62,-2.75 -5.08,2.75
3D body "BD021-02A-A1-0350-0200-0550-LB.stp": height 5.5, standoff 0, extent -5.08,-2.75 -2.54,2.75
3D body "BD021-02A-A1-0350-0200-0550-LB.stp": height 5.5, standoff 0, extent -2.54,-2.75 0,2.75
3D body "BD021-02A-A1-0350-0200-0550-LB.stp": height 5.5, standoff 0, extent 0,-2.75 2.54,2.75
3D body "BD021-02A-A1-0350-0200-0550-LB.stp": height 5.5, standoff 0, extent 2.54,-2.75 5.08,2.75
3D body "BD021-02A-A1-0350-0200-0550-LB.stp": height 5.5, standoff 0, extent 5.08,-2.75 7.62,2.75
3D body "BD021-02A-A1-0350-0200-0550-LB.stp": height 5.5, standoff 0, extent 7.62,-2.75 10.16,2.75
3D body "BD021-02A-A1-0350-0200-0550-LB.stp": height 5.5, standoff 0, extent 10.16,-2.75 12.7,2.75
3D body "BD021-02A-A1-0350-0200-0550-LB.stp": height 5.5, standoff 0, extent 12.7,-2.75 15.24,2.75
3D body "BD021-02A-A1-0350-0200-0550-LB.stp": height 5.5, standoff 0, extent 15.24,-2.75 17.78,2.75
3D body "BD021-02A-A1-0350-0200-0550-LB.stp": height 5.5, standoff 0, extent 17.78,-2.75 20.32,2.75
3D body "BD021-02A-A1-0350-0200-0550-LB.stp": height 5.5, standoff 0, extent 20.32,-2.75 22.86,2.75

## HDRMINIS_M_1X37 [mm] "mini header (50mil pitch)"
pads (37):
  oval 0.8x3.2 smd mask+0.1: 1(-22.86,1.4) 2(-21.59,-1.4) 3(-20.32,1.4) 4(-19.05,-1.4) 5(-17.78,1.4) 6(-16.51,-1.4) 7(-15.24,1.4) 8(-13.97,-1.4) 9(-12.7,1.4) 10(-11.43,-1.4) 11(-10.16,1.4) 12(-8.89,-1.4) 13(-7.62,1.4) 14(-6.35,-1.4) 15(-5.08,1.4) 16(-3.81,-1.4) 17(-2.54,1.4) 18(-1.27,-1.4) 19(0,1.4) 20(1.27,-1.4) 21(2.54,1.4) 22(3.81,-1.4) 23(5.08,1.4) 24(6.35,-1.4) 25(7.62,1.4) 26(8.89,-1.4) 27(10.16,1.4) 28(11.43,-1.4) 29(12.7,1.4) 30(13.97,-1.4) 31(15.24,1.4) 32(16.51,-1.4) 33(17.78,1.4) 34(19.05,-1.4) 35(20.32,1.4) 36(21.59,-1.4) 37(22.86,1.4)
Top Overlay:
  drawing of 187 lines, arcs and shapes, not listed
3D body "BD021-02A-A1-0350-0200-0550-LB.stp": height 5.5, standoff 0, extent 20.955,-2.75 23.495,2.75
3D body "BD021-02A-A1-0350-0200-0550-LB.stp": height 5.5, standoff 0, extent 18.415,-2.75 20.955,2.75
3D body "BD021-02A-A1-0350-0200-0550-LB.stp": height 5.5, standoff 0, extent 15.875,-2.75 18.415,2.75
3D body "BD021-02A-A1-0350-0200-0550-LB.stp": height 5.5, standoff 0, extent 13.335,-2.75 15.875,2.75
3D body "BD021-02A-A1-0350-0200-0550-LB.stp": height 5.5, standoff 0, extent 10.795,-2.75 13.335,2.75
3D body "BD021-02A-A1-0350-0200-0550-LB.stp": height 5.5, standoff 0, extent 8.255,-2.75 10.795,2.75
3D body "BD021-02A-A1-0350-0200-0550-LB.stp": height 5.5, standoff 0, extent 5.715,-2.75 8.255,2.75
3D body "BD021-02A-A1-0350-0200-0550-LB.stp": height 5.5, standoff 0, extent 3.175,-2.75 5.715,2.75
3D body "BD021-02A-A1-0350-0200-0550-LB.stp": height 5.5, standoff 0, extent 0.635,-2.75 3.175,2.75
3D body "BD021-02A-A1-0350-0200-0550-LB.stp": height 5.5, standoff 0, extent -1.905,-2.75 0.635,2.75
3D body "BD021-02A-A1-0350-0200-0550-LB.stp": height 5.5, standoff 0, extent -4.445,-2.75 -1.905,2.75
3D body "BD021-02A-A1-0350-0200-0550-LB.stp": height 5.5, standoff 0, extent -6.985,-2.75 -4.445,2.75
3D body "BD021-02A-A1-0350-0200-0550-LB.stp": height 5.5, standoff 0, extent -9.525,-2.75 -6.985,2.75
3D body "BD021-02A-A1-0350-0200-0550-LB.stp": height 5.5, standoff 0, extent -12.065,-2.75 -9.525,2.75
3D body "BD021-02A-A1-0350-0200-0550-LB.stp": height 5.5, standoff 0, extent -14.605,-2.75 -12.065,2.75
3D body "BD021-02A-A1-0350-0200-0550-LB.stp": height 5.5, standoff 0, extent -17.145,-2.75 -14.605,2.75
3D body "BD021-02A-A1-0350-0200-0550-LB.stp": height 5.5, standoff 0, extent -19.685,-2.75 -17.145,2.75
3D body "BD021-03A-A1-0350-0200-0550-LB.stp": height 5.5, standoff 0, extent -23.5,-2.75 -19.69,2.75

## HDRMINIS_M_1X38 [mm] "mini header (50mil pitch)"
pads (38):
  oval 0.8x3.2 smd mask+0.1: 1(-23.495,-1.4) 2(-22.225,1.4) 3(-20.955,-1.4) 4(-19.685,1.4) 5(-18.415,-1.4) 6(-17.145,1.4) 7(-15.875,-1.4) 8(-14.605,1.4) 9(-13.335,-1.4) 10(-12.065,1.4) 11(-10.795,-1.4) 12(-9.525,1.4) 13(-8.255,-1.4) 14(-6.985,1.4) 15(-5.715,-1.4) 16(-4.445,1.4) 17(-3.175,-1.4) 18(-1.905,1.4) 19(-0.635,-1.4) 20(0.635,1.4) 21(1.905,-1.4) 22(3.175,1.4) 23(4.445,-1.4) 24(5.715,1.4) 25(6.985,-1.4) 26(8.255,1.4) 27(9.525,-1.4) 28(10.795,1.4) 29(12.065,-1.4) 30(13.335,1.4) 31(14.605,-1.4) 32(15.875,1.4) 33(17.145,-1.4) 34(18.415,1.4) 35(19.685,-1.4) 36(20.955,1.4) 37(22.225,-1.4) 38(23.495,1.4)
Top Overlay:
  drawing of 193 lines, arcs and shapes, not listed
3D body "BD021-02A-A1-0350-0200-0550-LB.stp": height 5.5, standoff 0, extent -24.13,-2.75 -21.59,2.75
3D body "BD021-02A-A1-0350-0200-0550-LB.stp": height 5.5, standoff 0, extent -21.59,-2.75 -19.05,2.75
3D body "BD021-02A-A1-0350-0200-0550-LB.stp": height 5.5, standoff 0, extent -19.05,-2.75 -16.51,2.75
3D body "BD021-02A-A1-0350-0200-0550-LB.stp": height 5.5, standoff 0, extent -16.51,-2.75 -13.97,2.75
3D body "BD021-02A-A1-0350-0200-0550-LB.stp": height 5.5, standoff 0, extent -13.97,-2.75 -11.43,2.75
3D body "BD021-02A-A1-0350-0200-0550-LB.stp": height 5.5, standoff 0, extent -11.43,-2.75 -8.89,2.75
3D body "BD021-02A-A1-0350-0200-0550-LB.stp": height 5.5, standoff 0, extent -8.89,-2.75 -6.35,2.75
3D body "BD021-02A-A1-0350-0200-0550-LB.stp": height 5.5, standoff 0, extent -6.35,-2.75 -3.81,2.75
3D body "BD021-02A-A1-0350-0200-0550-LB.stp": height 5.5, standoff 0, extent -3.81,-2.75 -1.27,2.75
3D body "BD021-02A-A1-0350-0200-0550-LB.stp": height 5.5, standoff 0, extent -1.27,-2.75 1.27,2.75
3D body "BD021-02A-A1-0350-0200-0550-LB.stp": height 5.5, standoff 0, extent 1.27,-2.75 3.81,2.75
3D body "BD021-02A-A1-0350-0200-0550-LB.stp": height 5.5, standoff 0, extent 3.81,-2.75 6.35,2.75
3D body "BD021-02A-A1-0350-0200-0550-LB.stp": height 5.5, standoff 0, extent 6.35,-2.75 8.89,2.75
3D body "BD021-02A-A1-0350-0200-0550-LB.stp": height 5.5, standoff 0, extent 8.89,-2.75 11.43,2.75
3D body "BD021-02A-A1-0350-0200-0550-LB.stp": height 5.5, standoff 0, extent 11.43,-2.75 13.97,2.75
3D body "BD021-02A-A1-0350-0200-0550-LB.stp": height 5.5, standoff 0, extent 13.97,-2.75 16.51,2.75
3D body "BD021-02A-A1-0350-0200-0550-LB.stp": height 5.5, standoff 0, extent 16.51,-2.75 19.05,2.75
3D body "BD021-02A-A1-0350-0200-0550-LB.stp": height 5.5, standoff 0, extent 19.05,-2.75 21.59,2.75
3D body "BD021-02A-A1-0350-0200-0550-LB.stp": height 5.5, standoff 0, extent 21.59,-2.75 24.13,2.75

## HDRMINIS_M_1X39 [mm] "mini header (50mil pitch)"
pads (39):
  oval 0.8x3.2 smd mask+0.1: 1(-24.13,1.4) 2(-22.86,-1.4) 3(-21.59,1.4) 4(-20.32,-1.4) 5(-19.05,1.4) 6(-17.78,-1.4) 7(-16.51,1.4) 8(-15.24,-1.4) 9(-13.97,1.4) 10(-12.7,-1.4) 11(-11.43,1.4) 12(-10.16,-1.4) 13(-8.89,1.4) 14(-7.62,-1.4) 15(-6.35,1.4) 16(-5.08,-1.4) 17(-3.81,1.4) 18(-2.54,-1.4) 19(-1.27,1.4) 20(0,-1.4) 21(1.27,1.4) 22(2.54,-1.4) 23(3.81,1.4) 24(5.08,-1.4) 25(6.35,1.4) 26(7.62,-1.4) 27(8.89,1.4) 28(10.16,-1.4) 29(11.43,1.4) 30(12.7,-1.4) 31(13.97,1.4) 32(15.24,-1.4) 33(16.51,1.4) 34(17.78,-1.4) 35(19.05,1.4) 36(20.32,-1.4) 37(21.59,1.4) 38(22.86,-1.4) 39(24.13,1.4)
Top Overlay:
  drawing of 197 lines, arcs and shapes, not listed
3D body "BD021-03A-A1-0350-0200-0550-LB.stp": height 5.5, standoff 0, extent -24.77,-2.75 -20.96,2.75
3D body "BD021-02A-A1-0350-0200-0550-LB.stp": height 5.5, standoff 0, extent -20.955,-2.75 -18.415,2.75
3D body "BD021-02A-A1-0350-0200-0550-LB.stp": height 5.5, standoff 0, extent -18.415,-2.75 -15.875,2.75
3D body "BD021-02A-A1-0350-0200-0550-LB.stp": height 5.5, standoff 0, extent -15.875,-2.75 -13.335,2.75
3D body "BD021-02A-A1-0350-0200-0550-LB.stp": height 5.5, standoff 0, extent -13.335,-2.75 -10.795,2.75
3D body "BD021-02A-A1-0350-0200-0550-LB.stp": height 5.5, standoff 0, extent -10.795,-2.75 -8.255,2.75
3D body "BD021-02A-A1-0350-0200-0550-LB.stp": height 5.5, standoff 0, extent -8.255,-2.75 -5.715,2.75
3D body "BD021-02A-A1-0350-0200-0550-LB.stp": height 5.5, standoff 0, extent -5.715,-2.75 -3.175,2.75
3D body "BD021-02A-A1-0350-0200-0550-LB.stp": height 5.5, standoff 0, extent -3.175,-2.75 -0.635,2.75
3D body "BD021-02A-A1-0350-0200-0550-LB.stp": height 5.5, standoff 0, extent -0.635,-2.75 1.905,2.75
3D body "BD021-02A-A1-0350-0200-0550-LB.stp": height 5.5, standoff 0, extent 1.905,-2.75 4.445,2.75
3D body "BD021-02A-A1-0350-0200-0550-LB.stp": height 5.5, standoff 0, extent 4.445,-2.75 6.985,2.75
3D body "BD021-02A-A1-0350-0200-0550-LB.stp": height 5.5, standoff 0, extent 6.985,-2.75 9.525,2.75
3D body "BD021-02A-A1-0350-0200-0550-LB.stp": height 5.5, standoff 0, extent 9.525,-2.75 12.065,2.75
3D body "BD021-02A-A1-0350-0200-0550-LB.stp": height 5.5, standoff 0, extent 12.065,-2.75 14.605,2.75
3D body "BD021-02A-A1-0350-0200-0550-LB.stp": height 5.5, standoff 0, extent 14.605,-2.75 17.145,2.75
3D body "BD021-02A-A1-0350-0200-0550-LB.stp": height 5.5, standoff 0, extent 17.145,-2.75 19.685,2.75
3D body "BD021-02A-A1-0350-0200-0550-LB.stp": height 5.5, standoff 0, extent 19.685,-2.75 22.225,2.75
3D body "BD021-02A-A1-0350-0200-0550-LB.stp": height 5.5, standoff 0, extent 22.225,-2.75 24.765,2.75

## HDRMINIS_M_1X40 [mm] "mini header (50mil pitch)"
pads (40):
  oval 0.8x3.2 smd mask+0.1: 1(-24.765,-1.4) 2(-23.495,1.4) 3(-22.225,-1.4) 4(-20.955,1.4) 5(-19.685,-1.4) 6(-18.415,1.4) 7(-17.145,-1.4) 8(-15.875,1.4) 9(-14.605,-1.4) 10(-13.335,1.4) 11(-12.065,-1.4) 12(-10.795,1.4) 13(-9.525,-1.4) 14(-8.255,1.4) 15(-6.985,-1.4) 16(-5.715,1.4) 17(-4.445,-1.4) 18(-3.175,1.4) 19(-1.905,-1.4) 20(-0.635,1.4) 21(0.635,-1.4) 22(1.905,1.4) 23(3.175,-1.4) 24(4.445,1.4) 25(5.715,-1.4) 26(6.985,1.4) 27(8.255,-1.4) 28(9.525,1.4) 29(10.795,-1.4) 30(12.065,1.4) 31(13.335,-1.4) 32(14.605,1.4) 33(15.875,-1.4) 34(17.145,1.4) 35(18.415,-1.4) 36(19.685,1.4) 37(20.955,-1.4) 38(22.225,1.4) 39(23.495,-1.4) 40(24.765,1.4)
Top Overlay:
  drawing of 203 lines, arcs and shapes, not listed
3D body "BD021-02A-A1-0350-0200-0550-LB.stp": height 5.5, standoff 0, extent -25.4,-2.75 -22.86,2.75
3D body "BD021-02A-A1-0350-0200-0550-LB.stp": height 5.5, standoff 0, extent -22.86,-2.75 -20.32,2.75
3D body "BD021-02A-A1-0350-0200-0550-LB.stp": height 5.5, standoff 0, extent -20.32,-2.75 -17.78,2.75
3D body "BD021-02A-A1-0350-0200-0550-LB.stp": height 5.5, standoff 0, extent -17.78,-2.75 -15.24,2.75
3D body "BD021-02A-A1-0350-0200-0550-LB.stp": height 5.5, standoff 0, extent -15.24,-2.75 -12.7,2.75
3D body "BD021-02A-A1-0350-0200-0550-LB.stp": height 5.5, standoff 0, extent -12.7,-2.75 -10.16,2.75
3D body "BD021-02A-A1-0350-0200-0550-LB.stp": height 5.5, standoff 0, extent -10.16,-2.75 -7.62,2.75
3D body "BD021-02A-A1-0350-0200-0550-LB.stp": height 5.5, standoff 0, extent -7.62,-2.75 -5.08,2.75
3D body "BD021-02A-A1-0350-0200-0550-LB.stp": height 5.5, standoff 0, extent -5.08,-2.75 -2.54,2.75
3D body "BD021-02A-A1-0350-0200-0550-LB.stp": height 5.5, standoff 0, extent -2.54,-2.75 0,2.75
3D body "BD021-02A-A1-0350-0200-0550-LB.stp": height 5.5, standoff 0, extent 0,-2.75 2.54,2.75
3D body "BD021-02A-A1-0350-0200-0550-LB.stp": height 5.5, standoff 0, extent 2.54,-2.75 5.08,2.75
3D body "BD021-02A-A1-0350-0200-0550-LB.stp": height 5.5, standoff 0, extent 5.08,-2.75 7.62,2.75
3D body "BD021-02A-A1-0350-0200-0550-LB.stp": height 5.5, standoff 0, extent 7.62,-2.75 10.16,2.75
3D body "BD021-02A-A1-0350-0200-0550-LB.stp": height 5.5, standoff 0, extent 10.16,-2.75 12.7,2.75
3D body "BD021-02A-A1-0350-0200-0550-LB.stp": height 5.5, standoff 0, extent 12.7,-2.75 15.24,2.75
3D body "BD021-02A-A1-0350-0200-0550-LB.stp": height 5.5, standoff 0, extent 15.24,-2.75 17.78,2.75
3D body "BD021-02A-A1-0350-0200-0550-LB.stp": height 5.5, standoff 0, extent 17.78,-2.75 20.32,2.75
3D body "BD021-02A-A1-0350-0200-0550-LB.stp": height 5.5, standoff 0, extent 20.32,-2.75 22.86,2.75
3D body "BD021-02A-A1-0350-0200-0550-LB.stp": height 5.5, standoff 0, extent 22.86,-2.75 25.4,2.75

## HDRMINS_F_2X2 [mm] "HEADER FEMALE, SMT, 4, 1.27mm"
pads (4):
  oval 0.8x2.4 smd mask+0.1: 1(-0.635,2.2) 2(-0.635,-2.2) 3(0.635,2.2) 4(0.635,-2.2)
Top Overlay:
  circle w0.2: c-1.5,3.1 r0.2
  lines w0.2: -1.2,-1.6 -1.52,-1.6 -1.52,1.6 -1.2,1.6 ; 1.2,-1.6 1.52,-1.6 1.52,1.6 1.2,1.6
  text "1" at -1.82,1.9 h0.76
  text "2" at -1.8,-2.7 h0.76
3D body "User Library-1_27x1_27-SMD-female-2x2.step": height 4.5, standoff 0, extent -1.46,-2.3 1.46,2.3

## HDRMINS_F_2X3 [mm] "HEADER FEMALE, SMT, 8, 1.27mm"
pads (6):
  oval 0.8x2.4 smd mask+0.1: 1(-1.27,2.2) 2(-1.27,-2.2) 3(0,2.2) 4(0,-2.2) 5(1.27,2.2) 6(1.27,-2.2)
Top Overlay:
  circle w0.2: c-2.135,3.1 r0.2
  lines w0.2: -1.835,-1.6 -2.155,-1.6 -2.155,1.6 -1.835,1.6 ; 1.835,-1.6 2.155,-1.6 2.155,1.6 1.835,1.6
  text "2" at -2.435,-2.8 h0.76
  text "1" at -2.455,1.9 h0.76
3D body "User Library-1_27x1_27-SMD-female-2x2.step": height 4.5, standoff 0, extent -2.095,-2.3 0.825,2.3
3D body "User Library-1_27x1_27-SMD-female-2x2.step": height 4.5, standoff 0, extent -0.825,-2.3 2.095,2.3